# Altium footprint library DrPCB.PcbLib: 910 footprints (part 24 of 57)
Each footprint in its own frame and in the unit in brackets; x right, y up, seen from the top. Pads: shape width x height; smd on the part's side, far side on the other; paste and mask are expansions set on the pad; w line width, h text height; cw(c..) or ccw(c..) is an arc to the next point about the centre after c.
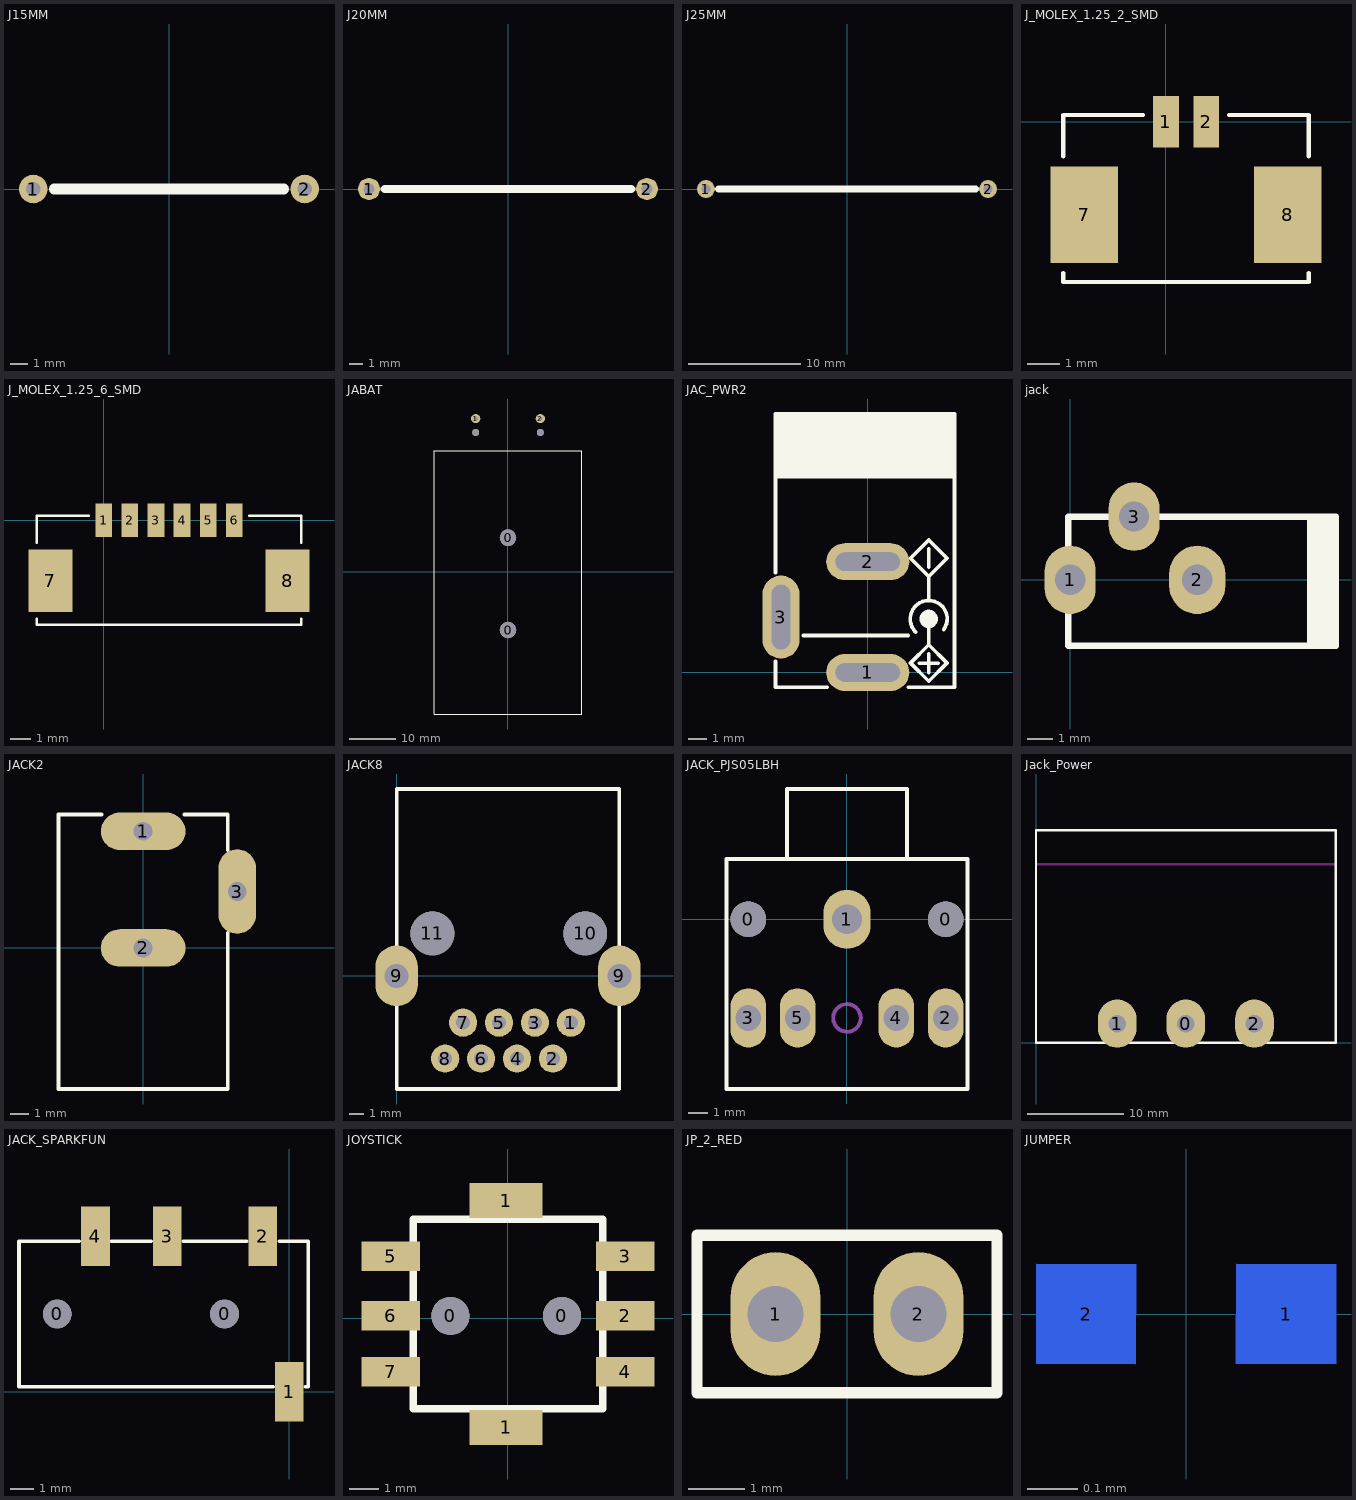
[diagram p23: the footprints below, top view; thin cyan lines are the x and y axes]

## J15MM [mm] "15.24 mm (600 mil) Jumper wire"
pads (2):
  round 1.6 hole 0.8: 1(-7.6,0) 2(7.6,0)
Top Overlay:
  lines w0.61: -6.426,0 6.426,0
3D body: height 0.85, standoff 0.15, extent -7.97,-0.35 -7.27,0.35
3D body: height 0.85, standoff 0.15, extent 7.27,-0.35 7.97,0.35
3D body: height 0.85, standoff 0.15, extent -7.62,-0.347 7.62,0.35
3D body: height 0.5, standoff -2, extent -7.97,-0.35 -7.27,0.35
3D body: height 0.5, standoff -2, extent 7.27,-0.35 7.97,0.35

## J20MM [mm] "20.32 mm (800 mil) Jumper wire"
pads (2):
  round 1.6 hole 0.8: 1(-10.1,0) 2(10.1,0)
Top Overlay:
  lines w0.61: -8.966,0 8.966,0
3D body: height 0.85, standoff 0.15, extent -10.51,-0.35 -9.81,0.35
3D body: height 0.85, standoff 0.15, extent 9.81,-0.35 10.51,0.35
3D body: height 0.5, standoff -2, extent -10.51,-0.35 -9.81,0.35
3D body: height 0.5, standoff -2, extent 9.81,-0.35 10.51,0.35
3D body: height 0.85, standoff 0.15, extent -10.16,-0.347 10.16,0.35

## J25MM [mm] "20.32 mm (800 mil) Jumper wire"
pads (2):
  round 1.6 hole 0.8: 1(-12.6,0) 2(12.6,0)
Top Overlay:
  lines w0.61: -11.466,0 11.508,0

## J_MOLEX_1.25_2_SMD [mm]
pads (4):
  rect 0.8x1.6 smd paste+0 mask+0.076: 1(0,0) 2(1.25,0)
  rect 2.1x3 smd paste+0 mask+0.076: 7(-2.55,-2.9) 8(3.796,-2.9)
Top Overlay:
  lines w0.127: -3.2,-4.72 -3.2,-5 4.445,-5 ; -3.2,-1.08 -3.2,0.2 -0.72,0.2 ; 1.966,0.2 4.446,0.2 4.446,-1.08 ; 4.446,-5 4.446,-4.72
3D body: height 0.25, standoff 0, extent 0,0 0.254,0.254
3D body "User Library-molex 53261 white.step": height 3.5, standoff 0, extent -3.203,-4.966 4.447,0.234

## J_MOLEX_1.25_6_SMD [mm]
pads (8):
  rect 0.8x1.6 smd paste+0 mask+0.076: 1(0,0) 2(1.25,0) 3(2.5,0) 4(3.75,0) 5(5,0) 6(6.25,0)
  rect 2.1x3 smd paste+0 mask+0.076: 7(-2.55,-2.9) 8(8.8,-2.9)
Top Overlay:
  lines w0.127: -3.2,-4.72 -3.2,-5 9.45,-5 9.45,-4.72 ; -3.2,-1.08 -3.2,0.2 -0.72,0.2 ; 6.97,0.2 9.45,0.2 9.45,-1.08
3D body: height 0.25, standoff 0, extent 0,0 0.254,0.254
3D body "User Library-molex 53261 white.step": height 3.5, standoff 0, extent -3.201,-4.991 9.449,0.209

## JABAT [mm]
pads (6):
  round 1.524 hole 1.5: 0(-6.912,30.154) 0\(7.088,30.154)
  round 3.6 hole 3.5: 0(0.088,-12.646) 0(0.088,7.354)
  round 2 hole 0.9: 1(-6.912,33.154) 2(7.088,33.154)
Top Overlay:
  lines w0.254: 16.056,-30.846 -15.912,-30.846 -15.912,26.154 16.088,26.154 16.088,-30.846

## JAC_PWR2 [mm] "DC POWER JACK, Power Jack KLDX-0202"
pads (3):
  oval 4.5x2 hole 1 slot 3.5 at 0 deg: 1(0,0) 2(0,6)
  oval 2x4.5 hole 1 slot 3.5 at 90 deg: 3(-4.7,3)
Top Overlay:
  circle w0.4: c3.3,2.9 r0.3
  rectangle: -5,10.5 4.7,14
  lines w0.2: -5,0.6 -5,-0.8 -2.2,-0.8 ; -5,5.4 -5,14 4.7,14 4.7,-0.8 2.2,-0.8 ; -3.5,2 2.2,2 ; 2.593,2.193 cw(c3.3,2.9) 4.119,2.326 ; 2.8,0.5 3.8,0.5 ; 3.3,0 3.3,1 ; 3.3,2.9 3.3,1.5 ; 3.3,3.9 3.3,5.2 ; 3.3,5.7 3.3,6.7 ; 3.3,1.5 4.29,0.51 3.3,-0.48 2.31,0.51 3.3,1.5 ; 3.3,5.2 2.31,6.19 3.3,7.18 4.29,6.19 3.3,5.2
3D body "KLDX-0202-A_rD2.STEP": height 10.8, standoff -4.1, extent -4.9,-0.65 4.5,13.85

## jack [mil]
pads (3):
  oval 79x106 hole 47: 1(0,0) 3(99,98)
  oval 87x106 hole 47: 2(197,0)
Top Overlay:
  lines w10: 372,-102 372,98 382,98 382,-102 ; 392,-102 392,98 402,98 402,-102 ; -3,-102 412,-102 412,98 -3,98 -3,-102

## JACK2 [mm]
pads (3):
  oval 4.5x2 hole 1: 1(0,6.194) 2(0,-0.006)
  oval 2x4.5 hole 1: 3(5,2.994)
Top Overlay:
  lines w0.2: -2.2,7.094 -4.5,7.094 -4.5,-7.506 4.5,-7.506 4.5,0.794 ; 2.2,7.094 4.5,7.094 4.5,5.194
3D body "DC Jack.STEP": height 11.01, standoff -3.49, extent -4.501,-7.449 4.508,6.56

## JACK8 [mm]
pads (12):
  round 2 hole 1: 1(12.319,-3.302) 2(11.049,-5.842) 3(9.779,-3.302) 4(8.509,-5.842) 5(7.239,-3.302) 6(5.969,-5.842) 7(4.699,-3.302) 8(3.429,-5.842)
  oval 3x4.3 hole 1.7: 9(0,0) 9(15.748,0)
  round 3.1 hole 3.1: 10(13.33,3.007) 11(2.53,3.007)
Top Overlay:
  lines w0.254: 0,-7.993 15.748,-7.993 15.748,13.208 0,13.208 0,-7.993

## JACK_PJS05LBH [mm] "Jack, Audio, Stereo, 3.5mm, RA, THD, PJS-05-LB-H"
pads (7):
  round 1.8 hole 1.8: 0(-5,0) 0(5,0)
  oval 2.4x3 hole 1.5: 1(0,0)
  oval 1.8x3 hole 1.3: 2(5,-5) 3(-5,-5) 4(2.5,-5) 5(-2.5,-5)
Top Overlay:
  lines w0.2: -3.048,3.048 -3.048,6.604 3.048,6.604 3.048,3.048 ; -6.1,-8.6 -6.1,3.048 0,3.048 6.096,3.048 6.096,-8.6 -6.1,-8.6
Mechanical 1:
  circle w0.2: c0,-5 r0.7
  circle w0.2: c5,0 r0.7
  circle w0.2: c-5,0 r0.7
3D body "User Library-PJS_05_LB_H.step": height 10, standoff -4.13, extent -6,-8.5 6,6.5

## Jack_Power [mm]
pads (3):
  oval 4x5 hole 1.8: 0(15.5,2) 1(8.4,2) 2(22.6,2)
Top Overlay:
  lines w0.254: -0.001,22.001 30.999,22.001 30.999,0.002 ; 0,22 0,0 31,0
Keep-Out Layer:
  text "PCB EDGE" at 1.537,19.202 h1
Keep-Out Layer:
  lines w0.254: 0.039,18.5 31.039,18.5

## JACK_SPARKFUN [mm]
pads (6):
  round 1.2 hole 1.2: 0(-9.7,3.25) 0(-2.7,3.25)
  rect 1.2x2.5 smd: 1(0,0) 2(-1.1,6.5) 3(-5.1,6.5) 4(-8.1,6.5)
Top Overlay:
  lines w0.15: -8.776,6.3 -11.3,6.3 -11.3,0.2 -0.673,0.2 ; -7.429,6.3 -5.779,6.3 ; -4.42,6.3 -1.778,6.3 ; -0.419,6.3 0.8,6.3 0.8,0.2 0.673,0.2
3D body "12639.STEP": height 5.46, standoff -0.14, extent -13.3,-0.749 0.8,7.251

## JOYSTICK [mm]
pads (10):
  round 1.3 hole 1.3: 0(-1.964,0.089) 0(1.846,0.089)
  rect 2.5x1.2 smd: 1(-0.059,-3.721) 1(-0.059,4.026)
  rect 2x1 smd: 2(4.005,0.089) 3(4.005,2.121) 4(4.005,-1.816) 5(-3.996,2.121) 6(-3.996,0.089) 7(-3.996,-1.816)
Top Overlay:
  lines w0.254: -3.234,-3.086 -3.234,3.391 3.243,3.391 3.243,-3.086 -3.234,-3.086

## JP_2_RED [mm] "Jumper Header 2.54mm Pitch, Vertical, RED"
pads (2):
  oval 1.6x2.2 hole 1: 1(-1.27,0) 2(1.27,0)
Top Overlay:
  lines w0.2: -2.67,-1.4 -2.67,1.4 2.67,1.4 2.67,-1.4 -2.67,-1.4
3D body "header02.STEP": height 8.38, standoff -2.54, extent -2.54,-1.27 2.54,1.27
3D body "jumper_akspt_g-red.STEP": height 8.57, standoff 2.6, extent -2.49,-1.22 2.49,1.22

## JUMPER [mm]
pads (2):
  rect 0.2x0.2 smd far side: 1(0.2,0) 2(-0.2,0)